# Altium footprint library XU-GENARAL PCB .PcbLib: 1176 footprints (part 69 of 75)
Each footprint in its own frame and in the unit in brackets; x right, y up, seen from the top. Pads: shape width x height; smd on the part's side, far side on the other; paste and mask are expansions set on the pad; w line width, h text height; cw(c..) or ccw(c..) is an arc to the next point about the centre after c.
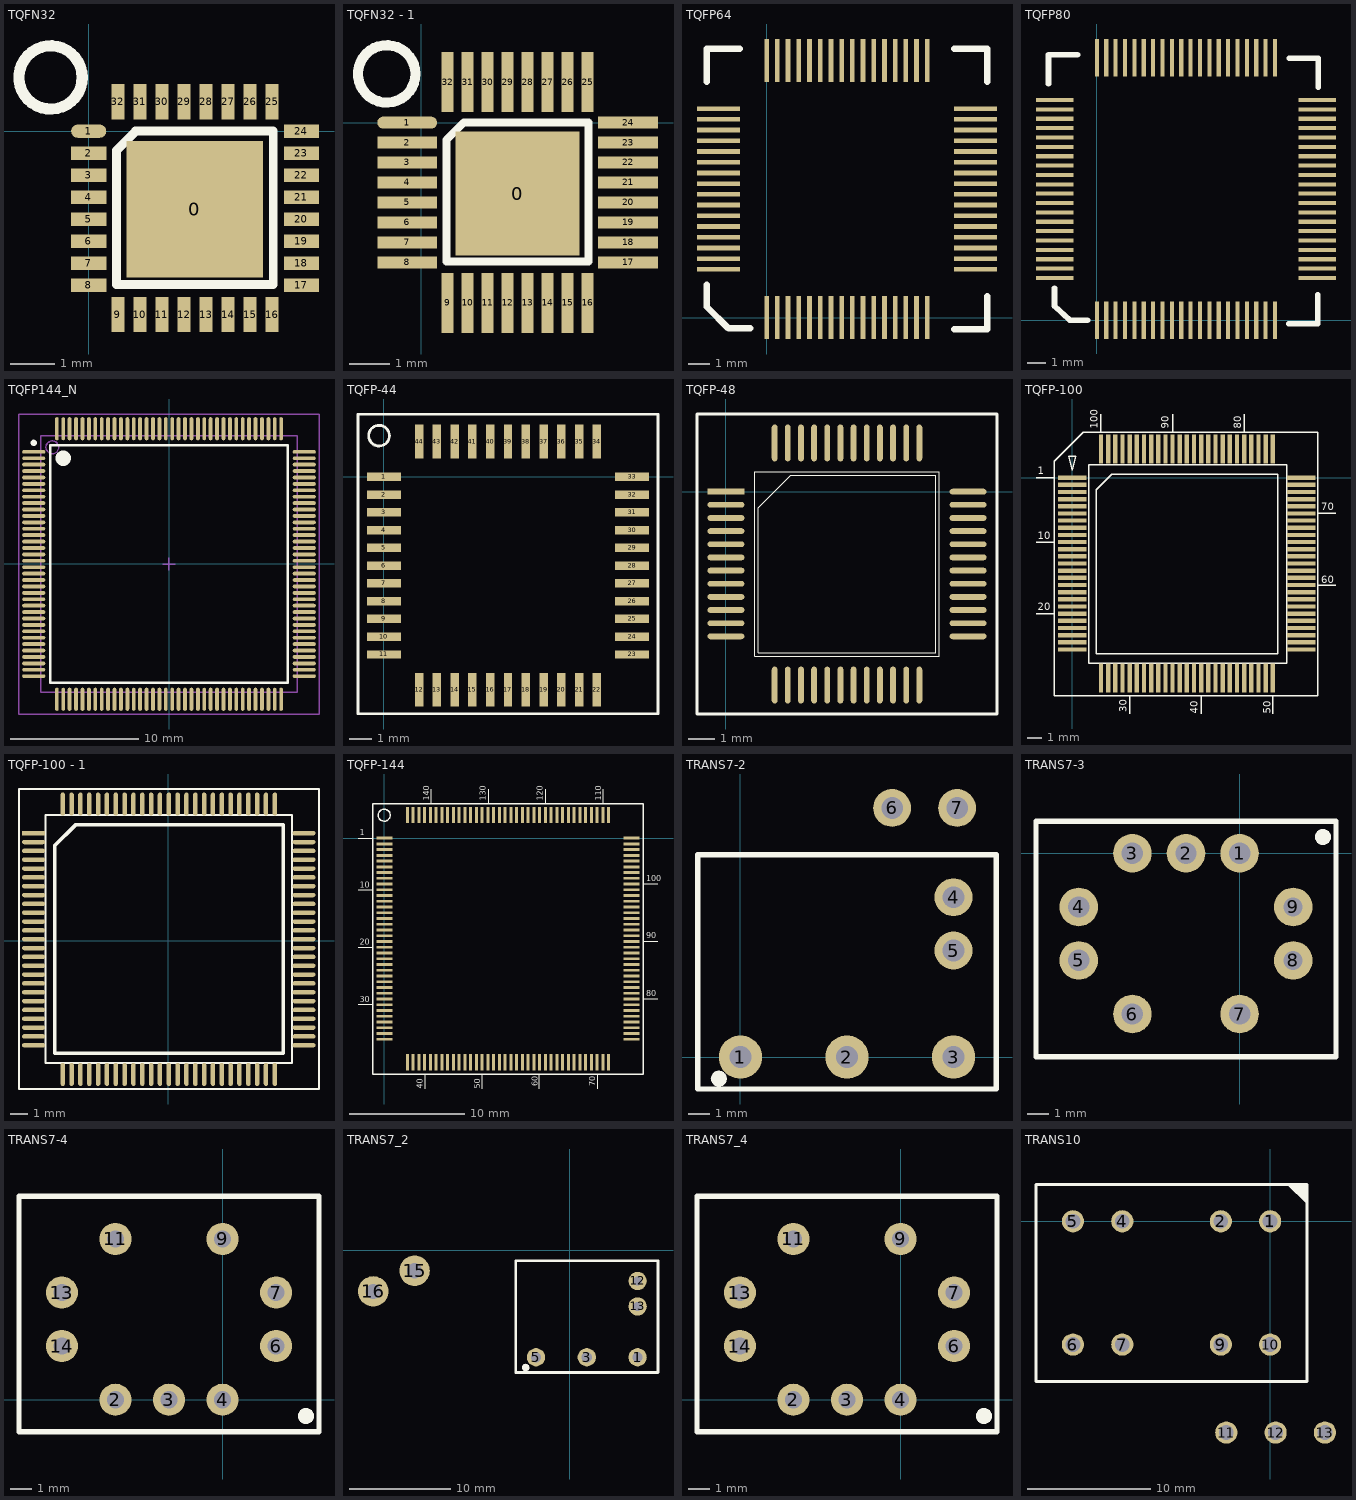
[diagram p68: the footprints below, top view; thin cyan lines are the x and y axes]

## TQFN32 [mm]
pads (33):
  rect 3.1x3.1 smd: 0(2.413,-1.778)
  oval 0.8x0.3 smd: 1(0,0)
  rect 0.8x0.3 smd: 2(0,-0.5) 3(0,-1) 4(0,-1.5) 5(0,-2) 6(0,-2.5) 7(0,-3) 8(0,-3.5) 17(4.83,-3.5) 18(4.83,-3) 19(4.83,-2.5) 20(4.83,-2) 21(4.83,-1.5) 22(4.83,-1) 23(4.83,-0.5) 24(4.83,0)
  rect 0.3x0.8 smd: 9(0.665,-4.165) 10(1.165,-4.165) 11(1.665,-4.165) 12(2.165,-4.165) 13(2.665,-4.165) 14(3.165,-4.165) 15(3.665,-4.165) 16(4.165,-4.165) 25(4.165,0.665) 26(3.665,0.665) 27(3.165,0.665) 28(2.665,0.665) 29(2.165,0.665) 30(1.665,0.665) 31(1.165,0.665) 32(0.665,0.665)
Top Overlay:
  circle w0.254: c-0.864,1.219 r0.718
  lines w0.2: 0.635,-3.48 4.191,-3.48 4.191,0 1.067,0 0.635,-0.432 0.635,-3.48

## TQFN32 - 1 [mm]
pads (33):
  rect 3.1x3.1 smd: 0(2.413,-1.778)
  oval 1.5x0.3 smd: 1(-0.35,0)
  rect 1.5x0.3 smd: 2(-0.35,-0.5) 3(-0.35,-1) 4(-0.35,-1.5) 5(-0.35,-2) 6(-0.35,-2.5) 7(-0.35,-3) 8(-0.35,-3.5) 17(5.18,-3.5) 18(5.18,-3) 19(5.18,-2.5) 20(5.18,-2) 21(5.18,-1.5) 22(5.18,-1) 23(5.18,-0.5) 24(5.18,0)
  rect 0.3x1.5 smd: 9(0.665,-4.515) 10(1.165,-4.515) 11(1.665,-4.515) 12(2.165,-4.515) 13(2.665,-4.515) 14(3.165,-4.515) 15(3.665,-4.515) 16(4.165,-4.515) 25(4.165,1.015) 26(3.665,1.015) 27(3.165,1.015) 28(2.665,1.015) 29(2.165,1.015) 30(1.665,1.015) 31(1.165,1.015) 32(0.665,1.015)
Top Overlay:
  circle w0.254: c-0.864,1.219 r0.718
  lines w0.2: 0.635,-3.48 4.191,-3.48 4.191,0 1.067,0 0.635,-0.432 0.635,-3.48

## TQFP64 [mm]
pads (64):
  rect 0.22x2 smd: 1(0,0) 2(0.5,0) 3(1,0) 4(1.5,0) 5(2,0) 6(2.5,0) 7(3,0) 8(3.5,0) 9(4,0) 10(4.5,0) 11(5,0) 12(5.5,0) 13(6,0) 14(6.5,0) 15(7,0) 16(7.5,0) 33(7.5,12) 34(7,12) 35(6.5,12) 36(6,12) 37(5.5,12) 38(5,12) 39(4.5,12) 40(4,12) 41(3.5,12) 42(3,12) 43(2.5,12) 44(2,12) 45(1.5,12) 46(1,12) 47(0.5,12) 48(0,12)
  rect 2x0.22 smd: 17(9.753,2.25) 18(9.75,2.75) 19(9.75,3.25) 20(9.75,3.75) 21(9.75,4.25) 22(9.75,4.75) 23(9.75,5.25) 24(9.75,5.75) 25(9.75,6.25) 26(9.75,6.75) 27(9.75,7.25) 28(9.75,7.75) 29(9.75,8.25) 30(9.75,8.75) 31(9.75,9.25) 32(9.75,9.75) 49(-2.25,9.75) 50(-2.25,9.25) 51(-2.25,8.75) 52(-2.25,8.25) 53(-2.25,7.75) 54(-2.25,7.25) 55(-2.25,6.75) 56(-2.25,6.25) 57(-2.25,5.75) 58(-2.25,5.25) 59(-2.25,4.75) 60(-2.25,4.25) 61(-2.25,3.75) 62(-2.25,3.25) 63(-2.25,2.75) 64(-2.25,2.25)
Top Overlay:
  lines w0.305: -2.794,1.524 -2.794,0.508 -1.778,-0.508 -0.762,-0.508 ; -2.794,11.004 -2.794,12.546 -1.252,12.546 ; 8.75,12.542 10.292,12.542 ; 8.752,-0.546 10.294,-0.546 10.294,0.996 ; 10.294,10.996 10.294,12.539

## TQFP80 [mm]
pads (81):
  rect 0.22x2 smd: 1(0,0) 2(0.5,0) 3(1,0) 4(1.5,0) 5(2,0) 6(2.5,0) 7(3,0) 8(3.5,0) 9(4,0) 10(4.5,0) 11(5,0) 12(5.5,0) 13(6,0) 14(6.5,0) 15(7,0) 16(7.5,0) 17(8,0) 18(8.5,0) 19(9,0) 20(9.5,0) 41(9.5,14) 42(9,14) 43(8.5,14) 44(8,14) 45(7.5,14) 46(7,14) 47(6.5,14) 48(6,14) 49(5.5,14) 50(5,14) 51(4.5,14) 52(4,14) 53(3.5,14) 54(3,14) 55(2.5,14) 56(2,14) 57(1.5,14) 58(1,14) 59(0.5,14) 60(0,14)
  rect 2x0.22 smd: 21(11.753,2.25) 22(11.753,2.75) 23(11.753,3.25) 24(11.753,3.75) 25(11.753,4.25) 26(11.753,4.75) 27(11.753,5.25) 28(11.753,5.75) 29(11.753,6.25) 30(11.753,6.75) 31(11.753,7.25) 32(11.753,7.75) 33(11.753,8.25) 34(11.753,8.75) 35(11.753,9.25) 36(11.753,9.75) 37(11.753,10.25) 38(11.753,10.75) 39(11.753,11.25) 40(11.753,11.75) 61(-2.25,11.75) 61(-2.25,11.75) 62(-2.25,11.25) 63(-2.25,10.75) 64(-2.25,10.25) 65(-2.25,9.75) 66(-2.25,9.25) 67(-2.25,8.75) 68(-2.25,8.25) 69(-2.25,7.75) 70(-2.25,7.25) 71(-2.25,6.75) 72(-2.25,6.25) 73(-2.25,5.75) 74(-2.25,5.25) 75(-2.25,4.75) 76(-2.25,4.25) 77(-2.25,3.75) 78(-2.25,3.25) 79(-2.25,2.75) 80(-2.25,2.25)
Top Overlay:
  lines w0.305: -2.581,12.613 -2.581,14.155 -1.039,14.155 ; -2.261,0.762 -1.446,0 -0.508,0 ; -2.261,0.786 -2.261,1.702 ; 10.234,-0.181 11.777,-0.181 11.777,1.361 ; 10.258,13.974 11.8,13.974 ; 11.802,12.428 11.802,13.97

## TQFP144_N [mm] "144-Pin Thin Quad Flat Pack 0.5 mm Pitch, IPC Medium Density"
height 1.6
pads (144):
  oval 1.8x0.3 smd: 1(-10.55,8.75) 2(-10.55,8.25) 3(-10.55,7.75) 4(-10.55,7.25) 5(-10.55,6.75) 6(-10.55,6.25) 7(-10.55,5.75) 8(-10.55,5.25) 9(-10.55,4.75) 10(-10.55,4.25) 11(-10.55,3.75) 12(-10.55,3.25) 13(-10.55,2.75) 14(-10.55,2.25) 15(-10.55,1.75) 16(-10.55,1.25) 17(-10.55,0.75) 18(-10.55,0.25) 19(-10.55,-0.25) 20(-10.55,-0.75) 21(-10.55,-1.25) 22(-10.55,-1.75) 23(-10.55,-2.25) 24(-10.55,-2.75) 25(-10.55,-3.25) 26(-10.55,-3.75) 27(-10.55,-4.25) 28(-10.55,-4.75) 29(-10.55,-5.25) 30(-10.55,-5.75) 31(-10.55,-6.25) 32(-10.55,-6.75) 33(-10.55,-7.25) 34(-10.55,-7.75) 35(-10.55,-8.25) 36(-10.55,-8.75) 73(10.55,-8.75) 74(10.55,-8.25) 75(10.55,-7.75) 76(10.55,-7.25) 77(10.55,-6.75) 78(10.55,-6.25) 79(10.55,-5.75) 80(10.55,-5.25) 81(10.55,-4.75) 82(10.55,-4.25) 83(10.55,-3.75) 84(10.55,-3.25) 85(10.55,-2.75) 86(10.55,-2.25) 87(10.55,-1.75) 88(10.55,-1.25) 89(10.55,-0.75) 90(10.55,-0.25) 91(10.55,0.25) 92(10.55,0.75) 93(10.55,1.25) 94(10.55,1.75) 95(10.55,2.25) 96(10.55,2.75) 97(10.55,3.25) 98(10.55,3.75) 99(10.55,4.25) 100(10.55,4.75) 101(10.55,5.25) 102(10.55,5.75) 103(10.55,6.25) 104(10.55,6.75) 105(10.55,7.25) 106(10.55,7.75) 107(10.55,8.25) 108(10.55,8.75)
  oval 0.3x1.8 smd: 37(-8.75,-10.55) 38(-8.25,-10.55) 39(-7.75,-10.55) 40(-7.25,-10.55) 41(-6.75,-10.55) 42(-6.25,-10.55) 43(-5.75,-10.55) 44(-5.25,-10.55) 45(-4.75,-10.55) 46(-4.25,-10.55) 47(-3.75,-10.55) 48(-3.25,-10.55) 49(-2.75,-10.55) 50(-2.25,-10.55) 51(-1.75,-10.55) 52(-1.25,-10.55) 53(-0.75,-10.55) 54(-0.25,-10.55) 55(0.25,-10.55) 56(0.75,-10.55) 57(1.25,-10.55) 58(1.75,-10.55) 59(2.25,-10.55) 60(2.75,-10.55) 61(3.25,-10.55) 62(3.75,-10.55) 63(4.25,-10.55) 64(4.75,-10.55) 65(5.25,-10.55) 66(5.75,-10.55) 67(6.25,-10.55) 68(6.75,-10.55) 69(7.25,-10.55) 70(7.75,-10.55) 71(8.25,-10.55) 72(8.75,-10.55) 109(8.75,10.55) 110(8.25,10.55) 111(7.75,10.55) 112(7.25,10.55) 113(6.75,10.55) 114(6.25,10.55) 115(5.75,10.55) 116(5.25,10.55) 117(4.75,10.55) 118(4.25,10.55) 119(3.75,10.55) 120(3.25,10.55) 121(2.75,10.55) 122(2.25,10.55) 123(1.75,10.55) 124(1.25,10.55) 125(0.75,10.55) 126(0.25,10.55) 127(-0.25,10.55) 128(-0.75,10.55) 129(-1.25,10.55) 130(-1.75,10.55) 131(-2.25,10.55) 132(-2.75,10.55) 133(-3.25,10.55) 134(-3.75,10.55) 135(-4.25,10.55) 136(-4.75,10.55) 137(-5.25,10.55) 138(-5.75,10.55) 139(-6.25,10.55) 140(-6.75,10.55) 141(-7.25,10.55) 142(-7.75,10.55) 143(-8.25,10.55) 144(-8.75,10.55)
Top Overlay:
  circle w0.6: c-8.25,8.25 r0.3
  circle w0.25: c-10.55,9.45 r0.125
  lines w0.2: -9.25,-9.25 9.25,-9.25 9.25,9.25 -9.25,9.25 -9.25,-9.25
Mechanical 13:
  circle w0.1: c-9.1,9.1 r0.5
  lines w0.1: -10,-10 10,-10 10,10 -10,10 -10,-10
Mechanical 15:
  lines w0.1: -0.5,0 0.5,0 ; 0,-0.5 0,0.5 ; -11.7,-11.7 11.7,-11.7 11.7,11.7 -11.7,11.7 -11.7,-11.7
3D body: height 1.6, standoff 0, extent -10,-10 10,10

## TQFP-44 [mil]
pads (44):
  rect 60x15 smd: 1(-0.01,-0.03) 2(-0.01,-31.53) 3(-0.01,-63.02) 4(-0.01,-94.52) 5(-0.01,-126.02) 6(-0.01,-157.51) 7(-0.01,-189.01) 8(-0.01,-220.5) 9(-0.01,-252) 10(-0.01,-283.5) 11(-0.01,-314.99) 23(439.99,-314.99) 24(439.99,-283.5) 25(439.99,-252) 26(439.99,-220.5) 27(439.99,-189.01) 28(439.99,-157.51) 29(439.99,-126.02) 30(439.99,-94.52) 31(439.99,-63.02) 32(439.99,-31.53) 33(439.99,-0.03)
  rect 15x60 smd: 12(62.51,-377.51) 13(94.01,-377.51) 14(125.5,-377.51) 15(157,-377.51) 16(188.5,-377.51) 17(219.99,-377.51) 18(251.49,-377.51) 19(282.98,-377.51) 20(314.48,-377.51) 21(345.98,-377.51) 22(377.47,-377.51) 34(377.47,62.49) 35(345.98,62.49) 36(314.48,62.49) 37(282.98,62.49) 38(251.49,62.49) 39(219.99,62.49) 40(188.5,62.49) 41(157,62.49) 42(125.5,62.49) 43(94.01,62.49) 44(62.51,62.49)
Top Overlay:
  circle w5: c-8.67,72.97 r18.34
  lines w5: -46.01,-420.03 -46.01,49.97 -46.01,110.97 15.99,110.97 485.99,110.97 485.99,-420.03 -46.01,-420.03

## TQFP-48 [mm]
pads (48):
  rect 1.4x0.22 smd: 1(0,0)
  oval 1.4x0.22 smd: 2(0,-0.5) 3(0,-1) 4(0,-1.5) 5(0,-2) 6(0,-2.5) 7(0,-3) 8(0,-3.5) 9(0,-4) 10(0,-4.5) 11(0,-5) 12(0,-5.5) 25(9.2,-5.5) 26(9.2,-5) 27(9.2,-4.5) 28(9.2,-4) 29(9.2,-3.5) 30(9.2,-3) 31(9.2,-2.5) 32(9.2,-2) 33(9.2,-1.5) 34(9.2,-1) 35(9.2,-0.5) 36(9.2,0)
  oval 0.22x1.4 smd: 13(1.85,-7.35) 14(2.35,-7.35) 15(2.85,-7.35) 16(3.35,-7.35) 17(3.85,-7.35) 18(4.35,-7.35) 19(4.85,-7.35) 20(5.35,-7.35) 21(5.85,-7.35) 22(6.35,-7.35) 23(6.85,-7.35) 24(7.35,-7.35) 37(7.35,1.85) 38(6.85,1.85) 39(6.35,1.85) 40(5.85,1.85) 41(5.35,1.85) 42(4.85,1.85) 43(4.35,1.85) 44(3.85,1.85) 45(3.35,1.85) 46(2.85,1.85) 47(2.35,1.85) 48(1.85,1.85)
Top Overlay:
  lines w0.025: 1.1,-6.25 1.1,-2.75 1.1,0.675 1.1,0.75 8.1,0.75 8.1,-6.25 1.1,-6.25 ; 1.235,-6.115 7.965,-6.115 7.965,0.615 2.47,0.615 1.235,-0.62 1.235,-6.115
  lines w0.102: -1.1,-8.45 10.3,-8.45 10.3,2.95 -1.1,2.95 -1.1,-8.45

## TQFP-100 [mm]
pads (100):
  rect 2x0.3 smd: 1(0,0) 2(0,-0.5) 3(0,-1) 4(0,-1.5) 5(0,-2) 6(0,-2.5) 7(0,-3) 8(0,-3.5) 9(0,-4) 10(0,-4.5) 11(0,-5) 12(0,-5.5) 13(0,-6) 14(0,-6.5) 15(0,-7) 16(0,-7.5) 17(0,-8) 18(0,-8.5) 19(0,-9) 20(0,-9.5) 21(0,-10) 22(0,-10.5) 23(0,-11) 24(0,-11.5) 25(0,-12) 51(16,-12) 52(16,-11.5) 53(16,-11) 54(16,-10.5) 55(16,-10) 56(16,-9.5) 57(16,-9) 58(16,-8.5) 59(16,-8) 60(16,-7.5) 61(16,-7) 62(16,-6.5) 63(16,-6) 64(16,-5.5) 65(16,-5) 66(16,-4.5) 67(16,-4) 68(16,-3.5) 69(16,-3) 70(16,-2.5) 71(16,-2) 72(16,-1.5) 73(16,-1) 74(16,-0.5) 75(16,0)
  rect 0.3x2 smd: 26(2,-14) 27(2.5,-14) 28(3,-14) 29(3.5,-14) 30(4,-14) 31(4.5,-14) 32(5,-14) 33(5.5,-14) 34(6,-14) 35(6.5,-14) 36(7,-14) 37(7.5,-14) 38(8,-14) 39(8.5,-14) 40(9,-14) 41(9.5,-14) 42(10,-14) 43(10.5,-14) 44(11,-14) 45(11.5,-14) 46(12,-14) 47(12.5,-14) 48(13,-14) 49(13.5,-14) 50(14,-14) 76(14,2) 77(13.5,2) 78(13,2) 79(12.5,2) 80(12,2) 81(11.5,2) 82(11,2) 83(10.5,2) 84(10,2) 85(9.5,2) 86(9,2) 87(8.5,2) 88(8,2) 89(7.5,2) 90(7,2) 91(6.5,2) 92(6,2) 93(5.5,2) 94(5,2) 95(4.5,2) 96(4,2) 97(3.5,2) 98(3,2) 99(2.5,2) 100(2,2)
Top Overlay:
  lines w0.1: -0.25,1.508 0.25,1.508 0,0.508 -0.25,1.508
  lines w0.102: -2.54,-9.5 -1.27,-9.5 ; -2.54,-4.5 -1.27,-4.5 ; -2.54,0 -1.27,0 ; 2,3.175 2,4.445 ; 4,-16.51 4,-15.24 ; 7,3.175 7,4.445 ; 9,-16.51 9,-15.24 ; 12,3.175 12,4.445 ; 14,-16.51 14,-15.24 ; 17.145,-7.5 18.415,-7.5 ; 17.145,-2.5 18.415,-2.5 ; -1.27,-15.24 -1.27,1.143 0.762,3.175 17.145,3.175 17.145,-15.24 -1.27,-15.24 ; 1.143,-12.954 1.143,0.889 14.986,0.889 14.986,-12.954 1.143,-12.954 ; 1.651,-12.319 14.351,-12.319 14.351,0.254 2.754,0.254 1.651,-0.849 1.651,-12.319
  text "100" at 1.778,3.429 h0.51
  text "90" at 6.731,3.429 h0.51
  text "80" at 11.811,3.429 h0.51
  text "70" at 17.399,-2.286 h0.51
  text "60" at 17.399,-7.366 h0.51
  text "50" at 13.843,-16.51 h0.51
  text "40" at 8.763,-16.51 h0.51
  text "30" at 3.81,-16.383 h0.51
  text "20" at -2.413,-9.271 h0.51
  text "10" at -2.413,-4.318 h0.51
  text "1" at -2.413,0.254 h0.51

## TQFP-100 - 1 [mm]
height 6.8
pads (100):
  rect 1.3x0.254 smd: 1(-7.62,6.096)
  oval 1.3x0.254 smd: 2(-7.62,5.596) 3(-7.62,5.096) 4(-7.62,4.596) 5(-7.62,4.096) 6(-7.62,3.596) 7(-7.62,3.096) 8(-7.62,2.596) 9(-7.62,2.096) 10(-7.62,1.596) 11(-7.62,1.096) 12(-7.62,0.596) 13(-7.62,0.096) 14(-7.62,-0.404) 15(-7.62,-0.904) 16(-7.62,-1.404) 17(-7.62,-1.904) 18(-7.62,-2.404) 19(-7.62,-2.904) 20(-7.62,-3.404) 21(-7.62,-3.904) 22(-7.62,-4.404) 23(-7.62,-4.904) 24(-7.62,-5.404) 25(-7.62,-5.904) 51(7.68,-5.904) 52(7.68,-5.404) 53(7.68,-4.904) 54(7.68,-4.404) 55(7.68,-3.904) 56(7.68,-3.404) 57(7.68,-2.904) 58(7.68,-2.404) 59(7.68,-1.904) 60(7.68,-1.404) 61(7.68,-0.904) 62(7.68,-0.404) 63(7.68,0.096) 64(7.68,0.596) 65(7.68,1.096) 66(7.68,1.596) 67(7.68,2.096) 68(7.68,2.596) 69(7.68,3.096) 70(7.68,3.596) 71(7.68,4.096) 72(7.68,4.596) 73(7.68,5.096) 74(7.68,5.596) 75(7.68,6.096)
  oval 0.254x1.3 smd: 26(-5.97,-7.554) 27(-5.47,-7.554) 28(-4.97,-7.554) 29(-4.47,-7.554) 30(-3.97,-7.554) 31(-3.47,-7.554) 32(-2.97,-7.554) 33(-2.47,-7.554) 34(-1.97,-7.554) 35(-1.47,-7.554) 36(-0.97,-7.554) 37(-0.47,-7.554) 38(0.03,-7.554) 39(0.53,-7.554) 40(1.03,-7.554) 41(1.53,-7.554) 42(2.03,-7.554) 43(2.53,-7.554) 44(3.03,-7.554) 45(3.53,-7.554) 46(4.03,-7.554) 47(4.53,-7.554) 48(5.03,-7.554) 49(5.53,-7.554) 50(6.03,-7.554) 76(6.03,7.746) 77(5.53,7.746) 78(5.03,7.746) 79(4.53,7.746) 80(4.03,7.746) 81(3.53,7.746) 82(3.03,7.746) 83(2.53,7.746) 84(2.03,7.746) 85(1.53,7.746) 86(1.03,7.746) 87(0.53,7.746) 88(0.03,7.746) 89(-0.47,7.746) 90(-0.97,7.746) 91(-1.47,7.746) 92(-1.97,7.746) 93(-2.47,7.746) 94(-2.97,7.746) 95(-3.47,7.746) 96(-3.97,7.746) 97(-4.47,7.746) 98(-4.97,7.746) 99(-5.47,7.746) 100(-5.97,7.746)
Top Overlay:
  lines w0.102: -8.445,-8.379 8.53,-8.379 8.53,8.596 -8.445,8.596 -8.445,-8.379 ; -6.945,-6.904 7.005,-6.904 7.005,7.121 -6.945,7.121 -6.945,-6.904
  lines w0.2: -6.435,-6.369 -6.435,5.376 -5.25,6.561 6.495,6.561 6.495,-6.369 -6.435,-6.369

## TQFP-144 [mm]
height 1.1
pads (144):
  rect 1.4x0.25 smd: 1(-0.004,-0.001) 2(-0.004,-0.501) 3(-0.004,-1.001) 4(-0.004,-1.501) 5(-0.004,-2.001) 6(-0.004,-2.501) 7(-0.004,-3.001) 8(-0.004,-3.501) 9(-0.004,-4.001) 10(-0.004,-4.501) 11(-0.004,-5.001) 12(-0.004,-5.501) 13(-0.004,-6.001) 14(-0.004,-6.501) 15(-0.004,-7.001) 16(-0.004,-7.501) 17(-0.004,-8.001) 18(-0.004,-8.501) 19(-0.004,-9.001) 20(-0.004,-9.501) 21(-0.004,-10.001) 22(-0.004,-10.501) 23(-0.004,-11.001) 24(-0.004,-11.501) 25(-0.004,-12.001) 26(-0.004,-12.501) 27(-0.004,-13.001) 28(-0.004,-13.501) 29(-0.004,-14.001) 30(-0.004,-14.501) 31(-0.004,-15.001) 32(-0.004,-15.501) 33(-0.004,-16.001) 34(-0.004,-16.501) 35(-0.004,-17.001) 36(-0.004,-17.501) 73(21.496,-17.501) 74(21.496,-17.001) 75(21.496,-16.501) 76(21.496,-16.001) 77(21.496,-15.501) 78(21.496,-15.001) 79(21.496,-14.501) 80(21.496,-14.001) 81(21.496,-13.501) 82(21.496,-13.001) 83(21.496,-12.501) 84(21.496,-12.001) 85(21.496,-11.501) 86(21.496,-11.001) 87(21.496,-10.501) 88(21.496,-10.001) 89(21.496,-9.501) 90(21.496,-9.001) 91(21.496,-8.501) 92(21.496,-8.001) 93(21.496,-7.501) 94(21.496,-7.001) 95(21.496,-6.501) 96(21.496,-6.001) 97(21.496,-5.501) 98(21.496,-5.001) 99(21.496,-4.501) 100(21.496,-4.001) 101(21.496,-3.501) 102(21.496,-3.001) 103(21.496,-2.501) 104(21.496,-2.001) 105(21.496,-1.501) 106(21.496,-1.001) 107(21.496,-0.501) 108(21.496,-0.001)
  rect 0.25x1.4 smd: 37(1.996,-19.501) 38(2.496,-19.501) 39(2.996,-19.501) 40(3.496,-19.501) 41(3.996,-19.501) 42(4.496,-19.501) 43(4.996,-19.501) 44(5.496,-19.501) 45(5.996,-19.501) 46(6.496,-19.501) 47(6.996,-19.501) 48(7.496,-19.501) 49(7.996,-19.501) 50(8.496,-19.501) 51(8.996,-19.501) 52(9.496,-19.501) 53(9.996,-19.501) 54(10.496,-19.501) 55(10.996,-19.501) 56(11.496,-19.501) 57(11.996,-19.501) 58(12.496,-19.501) 59(12.996,-19.501) 60(13.496,-19.501) 61(13.996,-19.501) 62(14.496,-19.501) 63(14.996,-19.501) 64(15.496,-19.501) 65(15.996,-19.501) 66(16.496,-19.501) 67(16.996,-19.501) 68(17.496,-19.501) 69(17.996,-19.501) 70(18.496,-19.501) 71(18.996,-19.501) 72(19.496,-19.501) 109(19.496,1.999) 110(18.996,1.999) 111(18.496,1.999) 112(17.996,1.999) 113(17.496,1.999) 114(16.996,1.999) 115(16.496,1.999) 116(15.996,1.999) 117(15.496,1.999) 118(14.996,1.999) 119(14.496,1.999) 120(13.996,1.999) 121(13.496,1.999) 122(12.996,1.999) 123(12.496,1.999) 124(11.996,1.999) 125(11.496,1.999) 126(10.996,1.999) 127(10.496,1.999) 128(9.996,1.999) 129(9.496,1.999) 130(8.996,1.999) 131(8.496,1.999) 132(7.996,1.999) 133(7.496,1.999) 134(6.996,1.999) 135(6.496,1.999) 136(5.996,1.999) 137(5.496,1.999) 138(4.996,1.999) 139(4.496,1.999) 140(3.996,1.999) 141(3.496,1.999) 142(2.996,1.999) 143(2.496,1.999) 144(1.996,1.999)
Top Overlay:
  circle w0.127: c-0.016,1.989 r0.522
  lines w0.102: -2.284,-14.478 -1.014,-14.478 ; -2.284,-9.5 -1.014,-9.5 ; -2.284,-4.5 -1.014,-4.5 ; -2.284,0 -1.014,0 ; 3.556,-21.831 3.556,-20.561 ; 4.064,2.999 4.064,4.269 ; 8.509,-21.831 8.509,-20.561 ; 9.05,2.999 9.05,4.269 ; 13.462,-21.831 13.462,-20.561 ; 14.05,2.999 14.05,4.269 ; 18.542,-21.831 18.542,-20.561 ; 19.05,2.999 19.05,4.269 ; 22.506,-13.97 23.776,-13.97 ; 22.506,-8.97 23.776,-8.97 ; 22.506,-3.97 23.776,-3.97
  lines w0.127: -1.014,-20.561 -1.014,2.999 22.506,2.999 22.506,-20.561 -1.014,-20.561
  text "20" at -2.157,-9.271 h0.51
  text "10" at -2.157,-4.318 h0.51
  text "1" at -2.157,0.254 h0.51
  text "30" at -2.157,-14.288 h0.51
  text "40" at 3.319,-21.831 h0.51
  text "50" at 8.352,-21.831 h0.51
  text "60" at 13.328,-21.577 h0.51
  text "70" at 18.328,-21.577 h0.51
  text "100" at 22.76,-3.748 h0.51
  text "90" at 22.76,-8.701 h0.51
  text "80" at 22.76,-13.781 h0.51
  text "130" at 8.828,3.253 h0.51
  text "120" at 13.781,3.253 h0.51
  text "110" at 18.861,3.253 h0.51
  text "140" at 3.875,3.253 h0.51

## TRANS7-2 [mil]
pads (8):
  round 80 hole 40: 1(0,0) 2(196.85,0) 3(393.7,0)
  round 70 hole 40: 4(393.7,295.28) 5(393.7,196.85) 6(280.26,460.31) 7(400.26,460.31)
  round 30 on Top Overlay: ""(-40,-40)
Top Overlay:
  lines w10: -78.74,-59.06 -78.74,374.02 472.44,374.02 472.44,-59.06 -78,-59.06

## TRANS7-3 [mm]
pads (10):
  round 1.8 hole 1: 1(0,0) 2(-2.5,0) 3(-5,0) 4(-7.5,-2.505) 5(-7.5,-5) 6(-5,-7.5) 7(0,-7.5)
  round 1.8 hole 0.889: 8(2.5,-5) 9(2.5,-2.505)
  round 0.762 on Top Overlay: ""(3.89,0.762)
Top Overlay:
  lines w0.254: -9.5,1.5 -9.5,-9.5 4.5,-9.5 4.5,1.5 -9.481,1.5

## TRANS7-4 [mm]
pads (10):
  round 1.5 hole 0.8: 2(-5,0) 3(-2.5,0) 4(0,0) 6(2.5,2.505) 7(2.5,5) 9(0,7.5) 11(-5,7.5) 13(-7.5,5) 14(-7.5,2.505)
  round 0.762 on Top Overlay: ""(3.89,-0.762)
Top Overlay:
  lines w0.254: -9.5,-1.5 -9.5,9.5 4.5,9.5 4.5,-1.5 -9.481,-1.5

## TRANS7_2 [mm]
pads (8):
  round 1.8 hole 1: 1(6.698,-10.541) 3(1.698,-10.541) 5(-3.302,-10.541)
  round 1.8 hole 0.889: 12(6.698,-3.041) 13(6.698,-5.541)
  round 3 hole 1.5: 15(-15.24,-2.032) 16(-19.304,-4.064)
  round 0.762 on Top Overlay: ""(-4.318,-11.557)
Top Overlay:
  lines w0.254: -5.302,-12.041 -5.302,-1.041 8.698,-1.041 8.698,-12.041 -5.283,-12.041

## TRANS7_4 [mm]
pads (10):
  round 1.5 hole 0.8: 2(-5,0) 3(-2.5,0) 4(0,0) 6(2.5,2.505) 7(2.5,5) 9(0,7.5) 11(-5,7.5) 13(-7.5,5) 14(-7.5,2.505)
  round 0.762 on Top Overlay: ""(3.89,-0.762)
Top Overlay:
  lines w0.254: -9.5,-1.5 -9.5,9.5 4.5,9.5 4.5,-1.5 -9.481,-1.5

## TRANS10 [mm]
pads (12):
  round 1.8 hole 1.2: 1(0,0) 1(0,0) 2(-4,0) 4(-12,0) 5(-16,0) 6(-16,-10) 7(-12,-10) 9(-4,-10) 10(0,-10) 11(-3.556,-17.145) 12(0.444,-17.145) 13(4.444,-17.145)
Top Overlay:
  rectangle: 2.794,1.778 3,2.159
  rectangle: 2.032,2.413 2.286,2.921
  rectangle: 2.286,2.159 2.54,2.921
  rectangle: 1.778,2.667 2.54,3
  rectangle: 2.54,1.905 3,3
  lines w0.254: 1.524,3 3,1.524 3,1.143 ; -19,-13 3,-13 3,3 -19,3 -19,-13